# Altium footprint library L3.PcbLib: 47 footprints (part 3 of 3)
Each footprint in its own frame and in the unit in brackets; x right, y up, seen from the top. Pads: shape width x height; smd on the part's side, far side on the other; paste and mask are expansions set on the pad; w line width, h text height; cw(c..) or ccw(c..) is an arc to the next point about the centre after c.
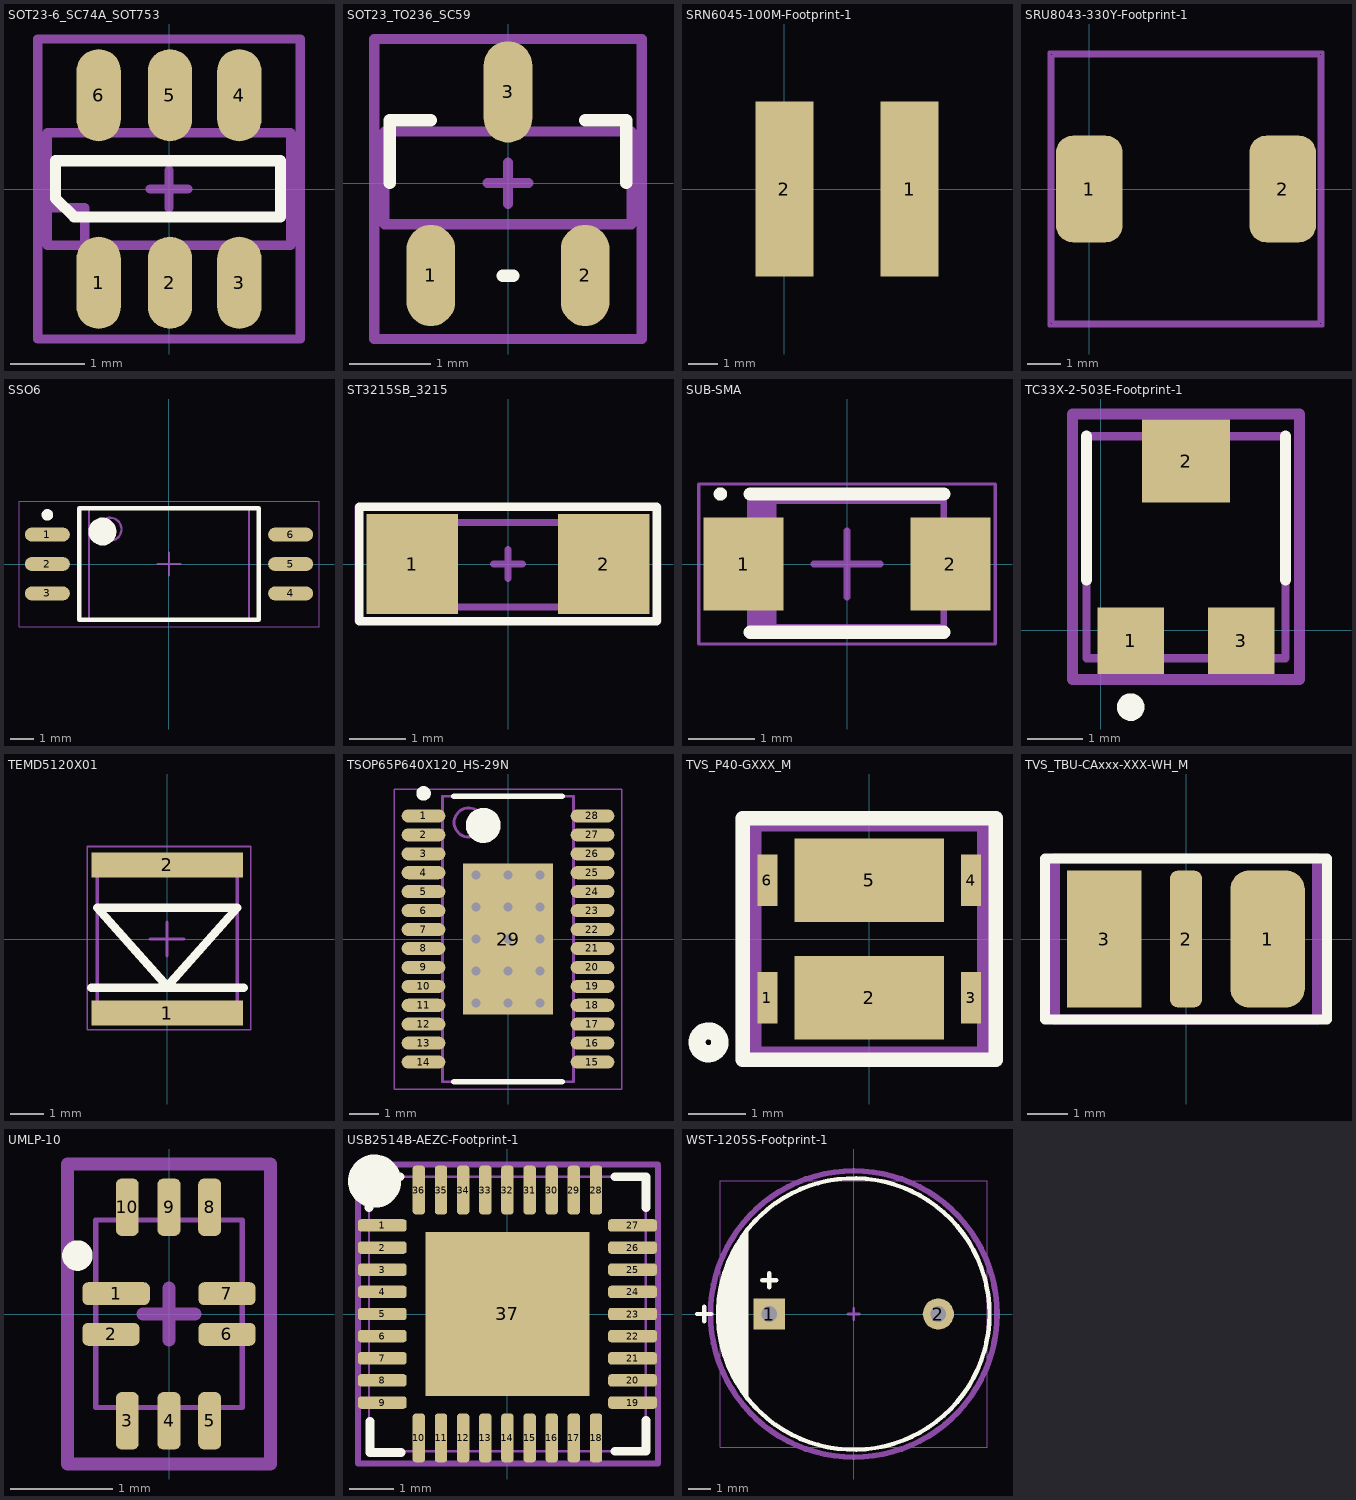
[diagram p2: the footprints below, top view; thin cyan lines are the x and y axes]

## SOT23-6_SC74A_SOT753 [mm]
pads (6):
  oval 0.6x1.25 smd: 1(-0.953,-1.27) 2(0.013,-1.27) 3(0.953,-1.27) 4(0.953,1.27) 5(0.013,1.27) 6(-0.953,1.27)
Top Overlay:
  lines w0.152: -1.537,-0.127 -1.283,-0.381 1.511,-0.381 1.511,0.381 -1.537,0.381 -1.537,-0.127
Mechanical 2:
  lines w0.127: -1.651,-0.127 -1.651,-0.762 ; -1.143,-0.762 -1.143,-0.254 -1.27,-0.254 -1.651,-0.254 -1.651,-0.762 ; -1.651,-0.762 1.651,-0.762 1.651,0.762 -1.651,0.762 -1.651,-0.762
Mechanical 4:
  lines w0.127: -1.778,0.254 -1.778,2.032 ; -0.254,0 0.254,0 ; 0,-0.254 0,0.254 ; -1.778,2.032 1.778,2.032 1.778,-2.032 -1.778,-2.032 -1.778,2.032
3D body "TSOT23-6.STEP": height 1, standoff 0, extent -1.45,-1.4 1.45,1.4

## SOT23_TO236_SC59 [mm]
pads (3):
  oval 0.6x1.25 smd: 1(-0.952,-1.141) 2(0.953,-1.141) 3(0,1.125)
Top Overlay:
  lines w0.152: -1.46,0 -1.46,0.775 -0.952,0.775 ; -0.063,-1.143 0.064,-1.143 ; 0.953,0.775 1.461,0.775 1.461,0
Mechanical 2:
  lines w0.127: -1.524,-0.508 1.524,-0.508 1.524,0.635 -1.524,0.635 -1.524,-0.508
Mechanical 4:
  lines w0.127: -0.254,0 0.254,0 ; 0,-0.254 0,0.254 ; -1.651,-1.925 1.651,-1.925 1.651,1.778 -1.651,1.778 -1.651,-1.925
3D body "SOT23-3.STEP": height 1.29, standoff -0.01, extent -1.45,-1.4 1.45,1.4

## SRN6045-100M-Footprint-1 [mm]
pads (2):
  rect 2x6 smd mask+0.07: 1(4.3,0) 2(0,0)
3D body "srn6045.stp": height 4.5, standoff 0, extent -0.9,-3 5.1,3

## SRU8043-330Y-Footprint-1 [mm]
pads (2):
  rrect50% 2x3.2 smd: 1(0,0) 2(5.8,0)
Mechanical 2:
  lines w0.1: -1.1,-4 6.9,-4 6.9,4 -1.1,4 -1.1,-4
Mechanical 6:
  lines w0.1: -1.2,-4.1 -1.2,4.1 7,4.1 7,-4.1 -1.2,-4.1
3D body "sru8043.stp": height 4.2, standoff -0.1, extent -1.1,-4 6.9,4

## SSO6 [mm] "SSO6,Strethed SO-6 package, IPC Medium Density"
height 1.7
pads (6):
  oval 1.95x0.6 smd: 1(-5.25,1.27) 2(-5.25,0) 3(-5.25,-1.27) 4(5.25,-1.27) 5(5.25,0) 6(5.25,1.27)
Top Overlay:
  circle w0.25: c-5.25,2.12 r0.125
  circle w0.6: c-2.875,1.4 r0.3
  lines w0.2: -3.875,-2.4 -3.875,2.4 3.875,2.4 3.875,-2.4 -3.875,-2.4
Mechanical 13:
  circle w0.1: c-2.55,1.5 r0.5
  lines w0.1: -3.45,-2.4 -3.45,2.4 3.45,2.4 3.45,-2.4 -3.45,-2.4
Mechanical 15:
  lines w0.05: -6.475,-2.7 -6.475,2.7 6.475,2.7 6.475,-2.7 -6.475,-2.7
  lines w0.1: -0.5,0 0.5,0 ; 0,-0.5 0,0.5
Mechanical 17:
  text "'.Designator'" at -3.683,-0.254 h0.64
3D body "User Library-SO-6W.STEP": height 3.3, standoff 0.02, extent -5.75,-2.294 5.75,2.286

## ST3215SB_3215 [mil]
pads (2):
  rect 64x70 smd: 1(-67,0) 2(67,0)
Top Overlay:
  lines w6: -104,-40 104,-40 104,40 -35,40 -104,40 -104,-40
Mechanical 13:
  lines w5: -82.41,-30 79,-30 79,29.06 -82.41,29.06 -82.41,-30
Mechanical 15:
  lines w5: -10,0 10,0 ; 0,-10 0,10 ; -105,-40 105,-40 105,40 -105,40 -105,-40
Mechanical 17:
  text "'.Designator'" at -75,-5 h12
3D body "User Library-CC5V-T1A_Tuning Fork Crystal.step": height 35.43, standoff -0.2, extent -82.41,-30 79,29.06

## SUB-SMA [mm] "sub SMA"
height 1.43
pads (2):
  rect 1.2x1.4 smd: 1(-1.55,0) 2(1.55,0)
Top Overlay:
  circle w0.1: c-1.9,1.05 r0.05
  lines w0.2: -1.45,-1.025 1.45,-1.025 ; -1.45,1.05 1.45,1.05
Mechanical 13:
  rectangle: -1.45,-0.95 -1.06,0.95
  lines w0.1: -1.45,-0.95 1.45,-0.95 1.45,0.95 -1.45,0.95 -1.45,-0.95
Mechanical 15:
  lines w0.05: -2.225,-1.2 2.225,-1.2 2.225,1.2 -2.225,1.2 -2.225,-1.2
  lines w0.1: -0.5,0 0.5,0 ; 0,-0.5 0,0.5
Mechanical 17:
  text "'.Designator'" at -1.1,-0.8 h0.25
Mechanical 19:
  text "'.Comment'" at -1.1,-0.8 h0.25
3D body "User Library-sub-sma.STEP": height 1.35, standoff 0, extent -1.85,-0.9 1.85,0.9

## TC33X-2-503E-Footprint-1 [mm]
pads (3):
  rect 1.2x1.2 smd paste+0 mask+0: 1(0.542,-0.189) 3(2.542,-0.189)
  rect 1.6x1.5 smd paste+0 mask+0: 2(1.542,3.061)
Top Overlay:
  circle w0.25: c0.542,-1.389 r0.125
  lines w0.2: -0.258,0.911 -0.258,3.511 ; 3.342,0.911 3.342,3.511
Mechanical 2:
  lines w0.15: -0.258,-0.508 -0.258,3.511 3.342,3.511 3.342,-0.508 -0.258,-0.508
Mechanical 4:
  lines w0.2: -0.508,-0.889 -0.508,3.911 3.592,3.911 3.592,-0.889 -0.508,-0.889
3D body "TC-33X-2.stp": height 1.13, standoff -0.02, extent -0.28,-0.497 3.32,3.465

## TEMD5120X01 [mm]
height 1.1
pads (2):
  rect 4.55x0.75 smd: 1(0,-2.225) 2(0,2.225)
Top Overlay:
  lines w0.254: -2.286,-1.463 2.286,-1.463 ; -2.108,0.94 2.098,0.94 -0.019,-1.444 ; -2.098,0.94 0.019,-1.444
Mechanical 13:
  lines w0.1: -2.1,-2.525 2.1,-2.525 2.1,2.489 -2.1,2.489 -2.1,-2.525
Mechanical 15:
  lines w0.05: -2.4,-2.725 -2.4,2.775 2.5,2.775 2.5,-2.725 -2.4,-2.725
  lines w0.1: -0.509,-0.001 0.491,-0.001 ; -0.009,-0.501 -0.009,0.499
Mechanical 17:
  text "'.Designator'" at -1.753,-0.102 h0.3
3D body: height 0.25, standoff 0, extent -5.334,-0.701 -5.334,-0.701
3D body: height 0.25, standoff 0, extent -5.969,0.315 -5.969,0.315
3D body: height 1.12, standoff 0.1, extent -2.1,-2.525 2.1,2.475

## TSOP65P640X120_HS-29N [mm] "TSOP, 28-Leads, Body 9.70x4.40mm, Pitch 0.65mm, Thermal Pad 5.18x3.10mm, IPC Medium Density"
height 1.2
pads (29):
  oval 1.5x0.45 smd: 1(-2.9,4.225) 2(-2.9,3.575) 3(-2.9,2.925) 4(-2.9,2.275) 5(-2.9,1.625) 6(-2.9,0.975) 7(-2.9,0.325) 8(-2.9,-0.325) 9(-2.9,-0.975) 10(-2.9,-1.625) 11(-2.9,-2.275) 12(-2.9,-2.925) 13(-2.9,-3.575) 14(-2.9,-4.225) 15(2.9,-4.225) 16(2.9,-3.575) 17(2.9,-2.925) 18(2.9,-2.275) 19(2.9,-1.625) 20(2.9,-0.975) 21(2.9,-0.325) 22(2.9,0.325) 23(2.9,0.975) 24(2.9,1.625) 25(2.9,2.275) 26(2.9,2.925) 27(2.9,3.575) 28(2.9,4.225)
  rect 3.1x5.18 smd: 29(0,0)
via 1.1,-2.2 diameter 0.6 hole 0.3
via 0,-2.2 diameter 0.6 hole 0.3
via -1.1,-2.2 diameter 0.6 hole 0.3
via 1.1,-1.1 diameter 0.6 hole 0.3
via 0,-1.1 diameter 0.6 hole 0.3
via -1.1,-1.1 diameter 0.6 hole 0.3
via 1.1,0 diameter 0.6 hole 0.3
via 0,0 diameter 0.6 hole 0.3
via -1.1,0 diameter 0.6 hole 0.3
via 1.1,1.1 diameter 0.6 hole 0.3
via 0,1.1 diameter 0.6 hole 0.3
via -1.1,1.1 diameter 0.6 hole 0.3
via 1.1,2.2 diameter 0.6 hole 0.3
via 0,2.2 diameter 0.6 hole 0.3
via -1.1,2.2 diameter 0.6 hole 0.3
Top Overlay:
  circle w0.6: c-0.85,3.9 r0.3
  circle w0.25: c-2.9,5 r0.125
  lines w0.2: -1.85,-4.9 1.85,-4.9 ; -1.85,4.9 1.85,4.9
Mechanical 13:
  circle w0.1: c-1.35,4 r0.5
  lines w0.1: -2.25,-4.9 2.25,-4.9 2.25,4.9 -2.25,4.9 -2.25,-4.9
Mechanical 15:
  lines w0.05: -3.9,-5.15 3.9,-5.15 3.9,5.15 -3.9,5.15 -3.9,-5.15
  lines w0.1: -0.5,0 0.5,0 ; 0,-0.5 0,0.5
3D body "TSOP65P640X120_HS-29N.step": height 1.2, standoff 0, extent -3.2,-4.9 3.2,4.9

## TVS_P40-GXXX_M [mm]
pads (6):
  rect 0.35x0.9 smd: 1(-1.775,-1.025) 3(1.775,-1.025) 4(1.775,1.025) 6(-1.775,1.025)
  rect 2.6x1.45 smd: 2(0,-1.025) 5(0,1.025)
Top Overlay:
  circle w0.3: c-2.8,-1.8 r0.2
  lines w0.254: -2.2,-2.1 -2.2,2.1 2.2,2.1 2.2,-2.1 -2.2,-2.1
Mechanical 13:
  lines w0.254: -2,-2 -2,2 2,2 2,-2 -2,-2
Mechanical 15:
  lines w0.254: -2.2,-2.1 -2.2,2.1 2.2,2.1 2.2,-2.1 -2.2,-2.1
Mechanical 17:
  text "'.Designator'" at -1.5,-1.6 h0.4
Mechanical 19:
  text "'.Comment'" at -1.6,-2.2 h0.64
3D body "p40.stp": height 0.85, standoff -0.03, extent -2,-2 2,2

## TVS_TBU-CAxxx-XXX-WH_M [mm]
pads (3):
  rrect50% 1.85x3.4 smd: 1(2.025,0)
  rrect50% 0.8x3.4 smd: 2(0,0)
  rect 1.85x3.4 smd: 3(-2.025,0)
Top Overlay:
  lines w0.254: -3.5,-2 3.5,-2 3.5,2 -3.5,2 -3.5,-2
Mechanical 13:
  lines w0.254: -3.25,-2 3.25,-2 3.25,2 -3.25,2 -3.25,-2
Mechanical 15:
  lines w0.254: -0.25,0 0.25,0 ; 0,-0.25 0,0.25 ; -3.25,-2 3.25,-2 3.25,2 -3.25,2 -3.25,-2
Mechanical 17:
  text "'.Designator'" at -3.55,-0.2 h0.64
Mechanical 19:
  text "'.Comment'" at -2.25,0 h0.64
3D body "User Library-Part+Studio+1.STEP": height 1, standoff -0.05, extent -3.25,-1.9 3.25,2.1

## UMLP-10 [mm]
pads (10):
  rrect50% 0.663x0.225 smd mask+0.07: 1(-0.52,0.2)
  rrect50% 0.563x0.225 smd mask+0.07: 2(-0.57,-0.2) 6(0.57,-0.2) 7(0.57,0.2)
  rrect50% 0.225x0.563 smd mask+0.07: 3(-0.41,-1.05) 4(0,-1.05) 5(0.4,-1.05) 8(0.4,1.05) 9(0,1.05) 10(-0.41,1.05)
Top Overlay:
  circle w0.2: c-0.9,0.575 r0.05
Mechanical 13:
  lines w0.051: -0.72,-0.92 0.72,-0.92 0.72,0.925 -0.72,0.925 -0.72,-0.92
Mechanical 15:
  lines w0.127: -0.254,0 0.254,0 ; 0,-0.254 0,0.254 ; -1,-1.475 -1,1.475 1,1.475 1,-1.475 -1,-1.475
3D body "User Library-UMLP-10.step": height 0.5, standoff 0, extent -0.72,-0.92 0.72,0.92

## USB2514B-AEZC-Footprint-1 [mm]
pads (37):
  rrect50% 1.1x0.28 smd paste+0 mask+0.05: 1(-2.825,2) 2(-2.825,1.5) 3(-2.825,1) 4(-2.825,0.5) 5(-2.825,0) 6(-2.825,-0.5) 7(-2.825,-1) 8(-2.825,-1.5) 9(-2.825,-2) 19(2.825,-2) 20(2.825,-1.5) 21(2.825,-1) 22(2.825,-0.5) 23(2.825,0) 24(2.825,0.5) 25(2.825,1) 26(2.825,1.5) 27(2.825,2)
  rrect50% 0.28x1.1 smd paste+0 mask+0.05: 10(-2,-2.8) 11(-1.5,-2.8) 12(-1,-2.8) 13(-0.5,-2.8) 14(0,-2.8) 15(0.5,-2.8) 16(1,-2.8) 17(1.5,-2.8) 18(2,-2.8) 28(2,2.8) 29(1.5,2.8) 30(1,2.8) 31(0.5,2.8) 32(0,2.8) 33(-0.5,2.8) 34(-1,2.8) 35(-1.5,2.8) 36(-2,2.8)
  rect 3.7x3.7 smd paste+0 mask+0.05: 37(0,0)
Top Overlay:
  circle w0.6: c-3,3 r0.3
  lines w0.2: -3.125,2.4 -3.125,3.1 -2.425,3.1 ; -3.1,-2.425 -3.1,-3.125 -2.4,-3.125 ; 2.425,-3.1 3.125,-3.1 3.125,-2.4 ; 2.425,3.1 3.125,3.1 3.125,2.4
Mechanical 2:
  lines w0.051: -3.125,-3.1 -3.125,3.1 3.125,3.1 3.125,-3.1 -3.125,-3.1
Mechanical 4:
  lines w0.127: -0.254,0 0.254,0 ; 0,-0.254 0,0.254 ; -3.375,-3.375 -3.375,3.375 3.4,3.375 3.4,-3.375 -3.375,-3.375
3D body "User Library-QFN36 (6x6).step": height 0.9, standoff 0.01, extent -3.102,-3.103 3.103,3.103

## WST-1205S-Footprint-1 [mm]
pads (2):
  rect 1.4x1.4 hole 0.7: 1(-3.8,0)
  round 1.4 hole 0.7: 2(3.8,0)
Top Overlay:
  circle w0.2: c0,0 r6.1
  region: -4.826,3.683 -5.207,3.302 -5.334,2.921 -5.461,2.667 -5.715,2.286 -5.842,1.905 -5.969,1.651 -5.969,1.016 -6.096,0.889 -6.096,-0.762 -5.969,-0.889 -5.969,-1.524 -5.842,-1.651 -5.715,-2.159 -5.461,-2.54 -5.461,-2.921 -4.953,-3.429 -4.953,-3.556 -4.826,-3.683
  lines w0.2: -7.048,0 -6.413,0 ; -6.731,-0.318 -6.731,0.318 ; -4.826,-3.683 -4.826,3.683 ; -4.118,1.524 -3.483,1.524 ; -3.8,1.206 -3.8,1.841
Mechanical 2:
  lines w0.051: -6,-6 -6,6 6,6 6,-6 -6,-6
Mechanical 4:
  circle w0.254: c0,0 r6.438
  lines w0.127: -0.254,0 0.254,0 ; 0,-0.254 0,0.254
3D body "cem-1212c.stp": height 9.5, standoff -4.5, extent -6,-6 6,6